# Altium footprint library WTR-PCB_LIB.PcbLib: 56 footprints (part 1 of 4)
Each footprint in its own frame and in the unit in brackets; x right, y up, seen from the top. Pads: shape width x height; smd on the part's side, far side on the other; paste and mask are expansions set on the pad; w line width, h text height; cw(c..) or ccw(c..) is an arc to the next point about the centre after c.
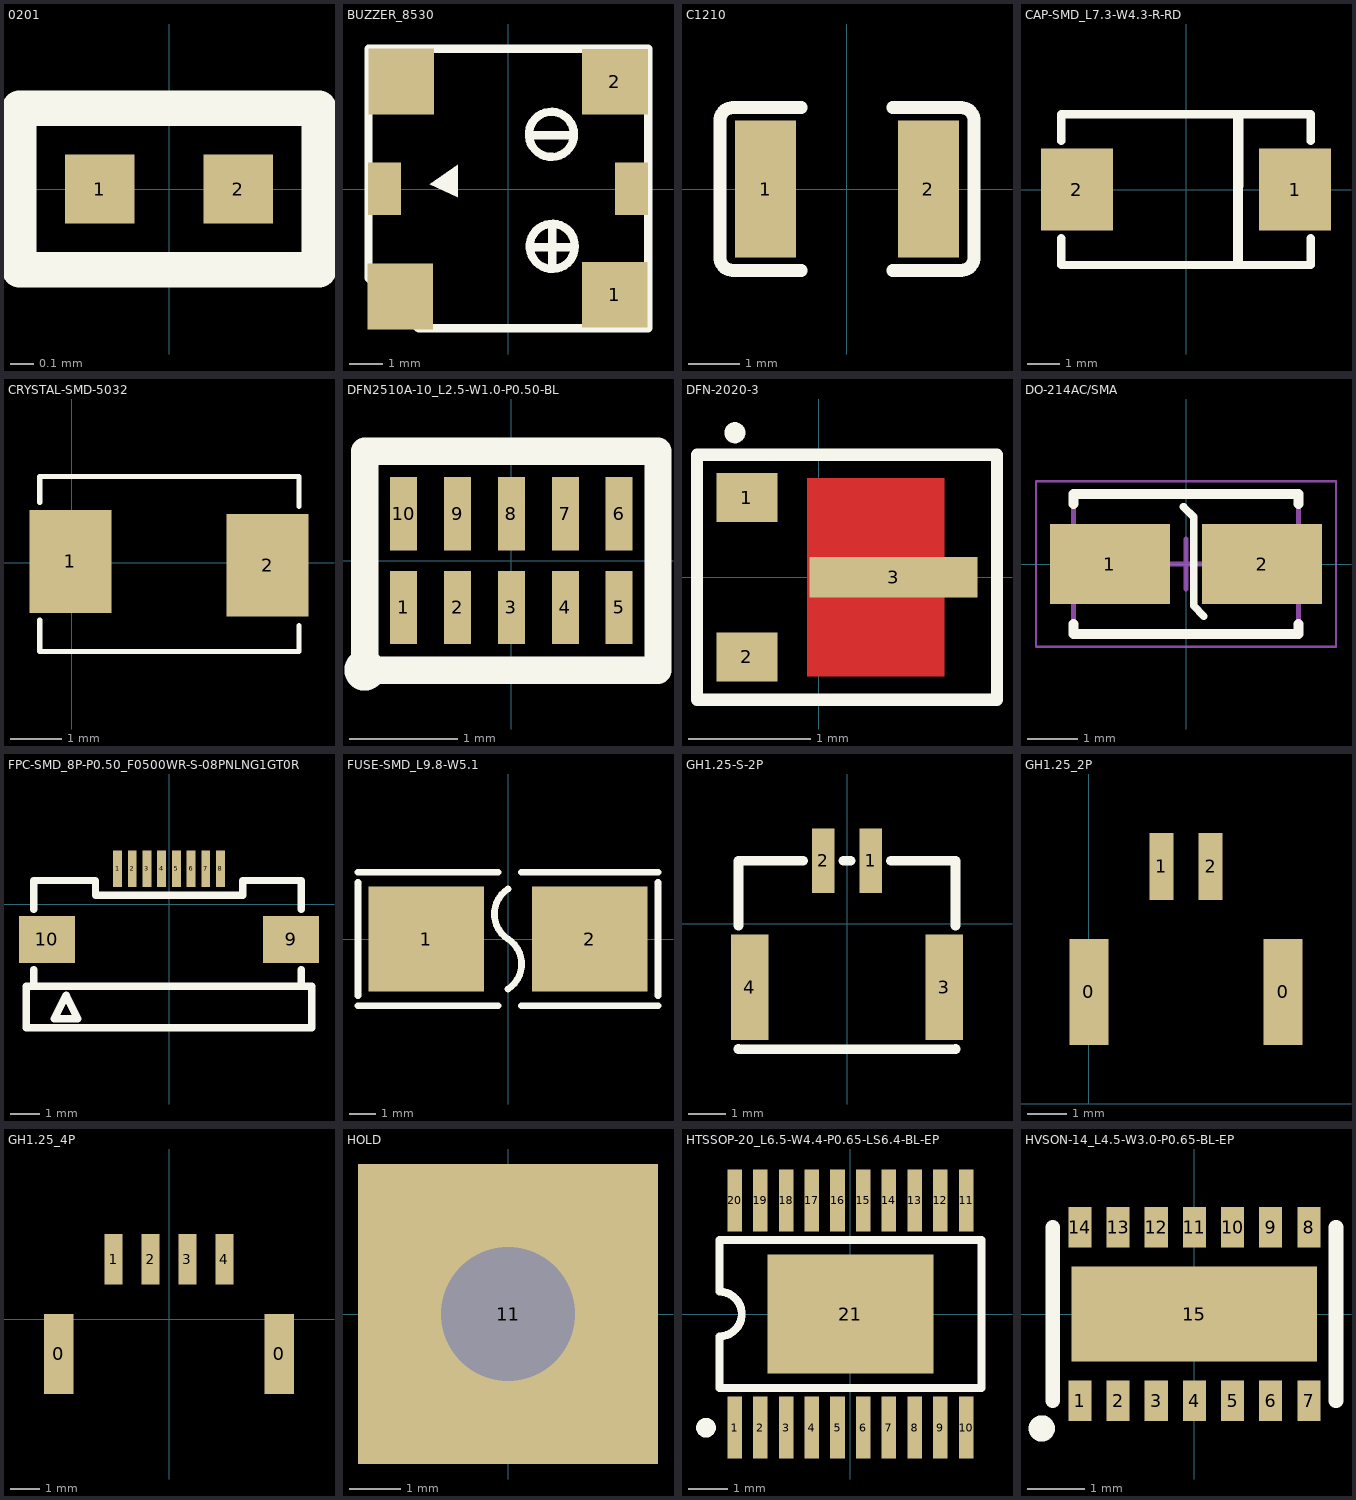
[diagram p0: the footprints below, top view; thin cyan lines are the x and y axes]

## 0201 [mm]
pads (2):
  rect 0.3x0.3 smd: 1(-0.3,0) 2(0.3,0)
Top Overlay:
  lines w0.152: -0.65,-0.35 -0.65,0.35 0.65,0.35 0.65,-0.35 -0.65,-0.35
3D body "R 0201.STEP": height 0.23, standoff 0, extent -0.3,-0.15 0.3,0.15

## BUZZER_8530 [mm]
pads (6):
  rect 2x2 smd: 1(3.242,-3.217) 2(3.251,3.26) ""(-3.277,-3.267) ""(-3.242,3.267)
  rect 1x1.6 smd: ""(-3.759,0.009) ""(3.759,0.009)
Top Overlay:
  circle w0.254: c1.321,1.66 r0.686
  circle w0.254: c1.346,-1.743 r0.686
  region: -2.38,0.144 -1.524,0.743 -1.524,-0.255
  lines w0.254: 0.686,-1.769 2.032,-1.769 ; 0.806,1.635 2.007,1.635 ; 1.346,-2.429 1.346,-1.083 ; -4.242,-2.709 -4.242,4.267 4.258,4.267 4.258,-4.233 -2.718,-4.233 -4.242,-2.709
3D body "User Library-MLT-8530.STEP": height 3, standoff 0, extent -4.377,-4.377 4.123,4.123

## C1210 [mm]
pads (2):
  rect 1.2x2.7 smd: 1(-1.6,0) 2(1.6,0)
Top Overlay:
  lines w0.254: -0.9,-1.6 -2.2,-1.6 -2.25,-1.6 cw(c-2.25,-1.35) -2.5,-1.35 -2.5,1.35 cw(c-2.25,1.35) -2.25,1.6 -2.2,1.6 -0.9,1.6 ; 0.9,-1.6 2.2,-1.6 2.25,-1.6 ccw(c2.25,-1.35) 2.5,-1.35 2.5,1.35 ccw(c2.25,1.35) 2.25,1.6 2.2,1.6 ; 0.9,1.6 2.2,1.6 ; 2.2,1.6 2.2,1.6

## CAP-SMD_L7.3-W4.3-R-RD [mm]
pads (2):
  rect 2.2x2.5 smd: 1(3.325,0) 2(-3.325,0)
Top Overlay:
  region: 1.448,2.286 1.448,-2.235 1.727,-2.235 1.753,2.337
  lines w0.254: -3.8,-1.481 -3.8,-2.3 3.8,-2.3 3.8,-1.481 ; -3.8,1.481 -3.8,2.3 3.8,2.3 3.8,1.481

## CRYSTAL-SMD-5032 [mm]
pads (2):
  rect 1.6x2 smd: 1(-0.025,0.025) 2(3.81,-0.051)
Top Overlay:
  lines w0.1: -0.622,-1.118 -0.622,-1.727 4.42,-1.727 4.42,-1.219 ; -0.622,1.168 -0.622,1.676 4.42,1.676 4.42,1.092
3D body "User Library-445-CRYTAL-SMD.STEP": height 1.35, standoff 0, extent -0.62,-1.625 4.38,1.575

## DFN2510A-10_L2.5-W1.0-P0.50-BL [mm]
pads (10):
  rect 0.25x0.68 smd: 1(-1,-0.435) 2(-0.5,-0.435) 3(0,-0.435) 4(0.5,-0.435) 5(1,-0.435) 6(1,0.435) 7(0.5,0.435) 8(0,0.435) 9(-0.5,0.435) 10(-1,0.435)
Top Overlay:
  circle w0.254: c-1.36,-1.016 r0.064
  lines w0.254: -1.36,-1.016 1.36,-1.016 1.36,1.016 -1.36,1.016 -1.36,-1.016
3D body "User Library-SOT1176-1-1.STEP": height 0.5, standoff -0.05, extent -1.25,-0.501 1.25,0.501

## DFN-2020-3 [mm]
pads (3):
  rect 0.5x0.4 smd: 1(-0.589,0.65) 2(-0.589,-0.65)
  rect 1.372x0.33 smd: 3(0.61,0)
Top Layer:
  region: -0.096,0.81 -0.096,-0.81 1.024,-0.81 1.024,-0.16 1.274,-0.16 1.274,0.16 1.024,0.16 1.024,0.81 0.044,0.81
Top Overlay:
  circle w0.1: c-0.686,1.18 r0.036
  lines w0.1: -0.996,-1 -0.996,1 1.454,1 1.454,-1 -0.996,-1
Top Paste:
  region: -0.096,0.81 -0.096,-0.81 1.024,-0.81 1.024,-0.16 1.274,-0.16 1.274,0.16 1.024,0.16 1.024,0.81 0.044,0.81
Top Solder:
  region: -0.203,0.914 -0.203,-0.914 1.118,-0.914 1.118,-0.229 1.346,-0.229 1.346,0.229 1.118,0.229 1.118,0.914

## DO-214AC/SMA [mm] "SS54"
height 2.42
pads (2):
  rect 2.4x1.6 smd: 1(-1.525,0) 2(1.525,0)
Top Overlay:
  lines w0.152: -0.051,1.143 0.152,0.94 0.152,-0.838 0.356,-1.041
  lines w0.2: -2.25,-1.2 -2.25,-1.4 2.25,-1.4 2.25,-1.2 ; -2.25,1.2 -2.25,1.4 2.25,1.4 2.25,1.2
Top Assembly:
  lines w0.1: -2.25,-1.4 2.25,-1.4 2.25,1.4 -2.25,1.4 -2.25,-1.4
Top Courtyard:
  lines w0.05: -3,-1.65 3,-1.65 3,1.65 -3,1.65 -3,-1.65
  lines w0.1: -0.5,0 0.5,0 ; 0,-0.5 0,0.5
3D body: height 2.42, standoff 0, extent -2.25,-1.4 2.25,1.4

## FPC-SMD_8P-P0.50_F0500WR-S-08PNLNG1GT0R [mm]
pads (10):
  rect 0.3x1.25 smd: 1(-1.75,1.2) 2(-1.25,1.2) 3(-0.75,1.2) 4(-0.25,1.2) 5(0.25,1.2) 6(0.75,1.2) 7(1.25,1.2) 8(1.75,1.2)
  rect 1.9x1.6 smd: 9(4.15,-1.2) 10(-4.15,-1.2)
Top Overlay:
  lines w0.254: -4.6,-2.623 -4.6,-2.231 ; -4.6,-0.169 -4.6,0.801 ; -4.6,0.8 -2.499,0.801 -2.499,0.301 2.5,0.301 2.5,0.801 4.501,0.801 4.501,-0.169 ; 4.501,-2.8 4.501,-2.231 ; -4.85,-4.2 4.85,-4.2 4.85,-2.8 -4.85,-2.8 -4.85,-4.2 ; -3.9,-3.9 -3.5,-3.1 -3.1,-3.9 -3.9,-3.9

## FUSE-SMD_L9.8-W5.1 [mm]
pads (2):
  rect 4.4x4 smd: 1(-3.11,0) 2(3.11,0)
Top Overlay:
  lines w0.254: -5.715,-2.54 -0.381,-2.54 ; -5.715,-2.159 -5.715,2.159 ; -5.715,2.54 -0.381,2.54 ; 0,-1.905 ccw(c-0.611,-0.953) 0,0 cw(c0.611,0.953) 0,1.905 ; 0.508,-2.54 5.715,-2.54 ; 0.508,2.54 5.715,2.54 ; 5.715,-2.159 5.715,2.159

## GH1.25-S-2P [mm]
pads (4):
  rect 0.6x1.7 smd: 1(0.625,1.675) 2(-0.625,1.675)
  rect 1x2.8 smd: 3(2.575,-1.675) 4(-2.575,-1.675)
Top Overlay:
  lines w0.254: -2.875,-3.306 -2.875,-3.325 2.875,-3.325 2.875,-3.306 ; -2.875,-0.044 -2.875,1.675 -1.156,1.675 ; -0.094,1.675 0.094,1.675 ; 1.156,1.675 2.875,1.675 2.875,-0.044

## GH1.25_2P [mm]
pads (4):
  rect 1x2.7 smd: 0(0,2.845) 0(4.95,2.845)
  rect 0.6x1.7 smd: 1(1.85,6.045) 2(3.1,6.045)

## GH1.25_4P [mm]
pads (6):
  rect 1x2.7 smd: 0(-3.725,-1.175) 0(3.725,-1.175)
  rect 0.6x1.7 smd: 1(-1.875,2.025) 2(-0.625,2.025) 3(0.625,2.025) 4(1.875,2.025)

## HOLD [mm]
pads (1):
  rect 5.8x5.8 hole 2.6: 11(0,0)

## HTSSOP-20_L6.5-W4.4-P0.65-LS6.4-BL-EP [mil]
pads (21):
  rect 14.5x61.5 smd: 1(-115.16,-113) 2(-89.57,-113) 3(-63.98,-113) 4(-38.39,-113) 5(-12.79,-113) 6(12.79,-113) 7(38.39,-113) 8(63.98,-113) 9(89.57,-113) 10(115.16,-113) 11(115.16,113) 12(89.57,113) 13(63.98,113) 14(38.39,113) 15(12.79,113) 16(-12.79,113) 17(-38.39,113) 18(-63.98,113) 19(-89.57,113) 20(-115.16,113)
  rect 165.35x118.11 smd: 21(0,0)
Top Overlay:
  lines w7.9: -130.31,-73.47 130.31,-73.47 130.31,73.48 -130.31,73.48 -130.31,22.3 cw(c-130.31,0) -130.3,-22.3 -130.31,-73.47
  lines w9.8: -143.7,-108.3 ccw(c-143.65,-113.2) -143.6,-108.3

## HVSON-14_L4.5-W3.0-P0.65-BL-EP [mm]
pads (15):
  rect 0.4x0.7 smd: 1(-1.98,-1.5) 2(-1.32,-1.5) 3(-0.66,-1.5) 4(0,-1.5) 5(0.66,-1.5) 6(1.32,-1.5) 7(1.98,-1.5) 8(1.98,1.5) 9(1.32,1.5) 10(0.66,1.5) 11(0,1.5) 12(-0.66,1.5) 13(-1.32,1.5) 14(-1.98,1.5)
  rect 4.25x1.65 smd: 15(0,0)
Top Overlay:
  circle w0.254: c-2.64,-1.98 r0.1
  lines w0.254: -2.45,-1.5 -2.45,1.5 ; 2.45,-1.5 2.45,1.5
3D body "User Library-TJA1043TK.STEP": height 0.82, standoff -0.03, extent -2.25,-1.5 2.25,1.5